# Altium footprint library PcbLib1.PcbLib: 212 footprints (part 3 of 14)
Each footprint in its own frame and in the unit in brackets; x right, y up, seen from the top. Pads: shape width x height; smd on the part's side, far side on the other; paste and mask are expansions set on the pad; w line width, h text height; cw(c..) or ccw(c..) is an arc to the next point about the centre after c.
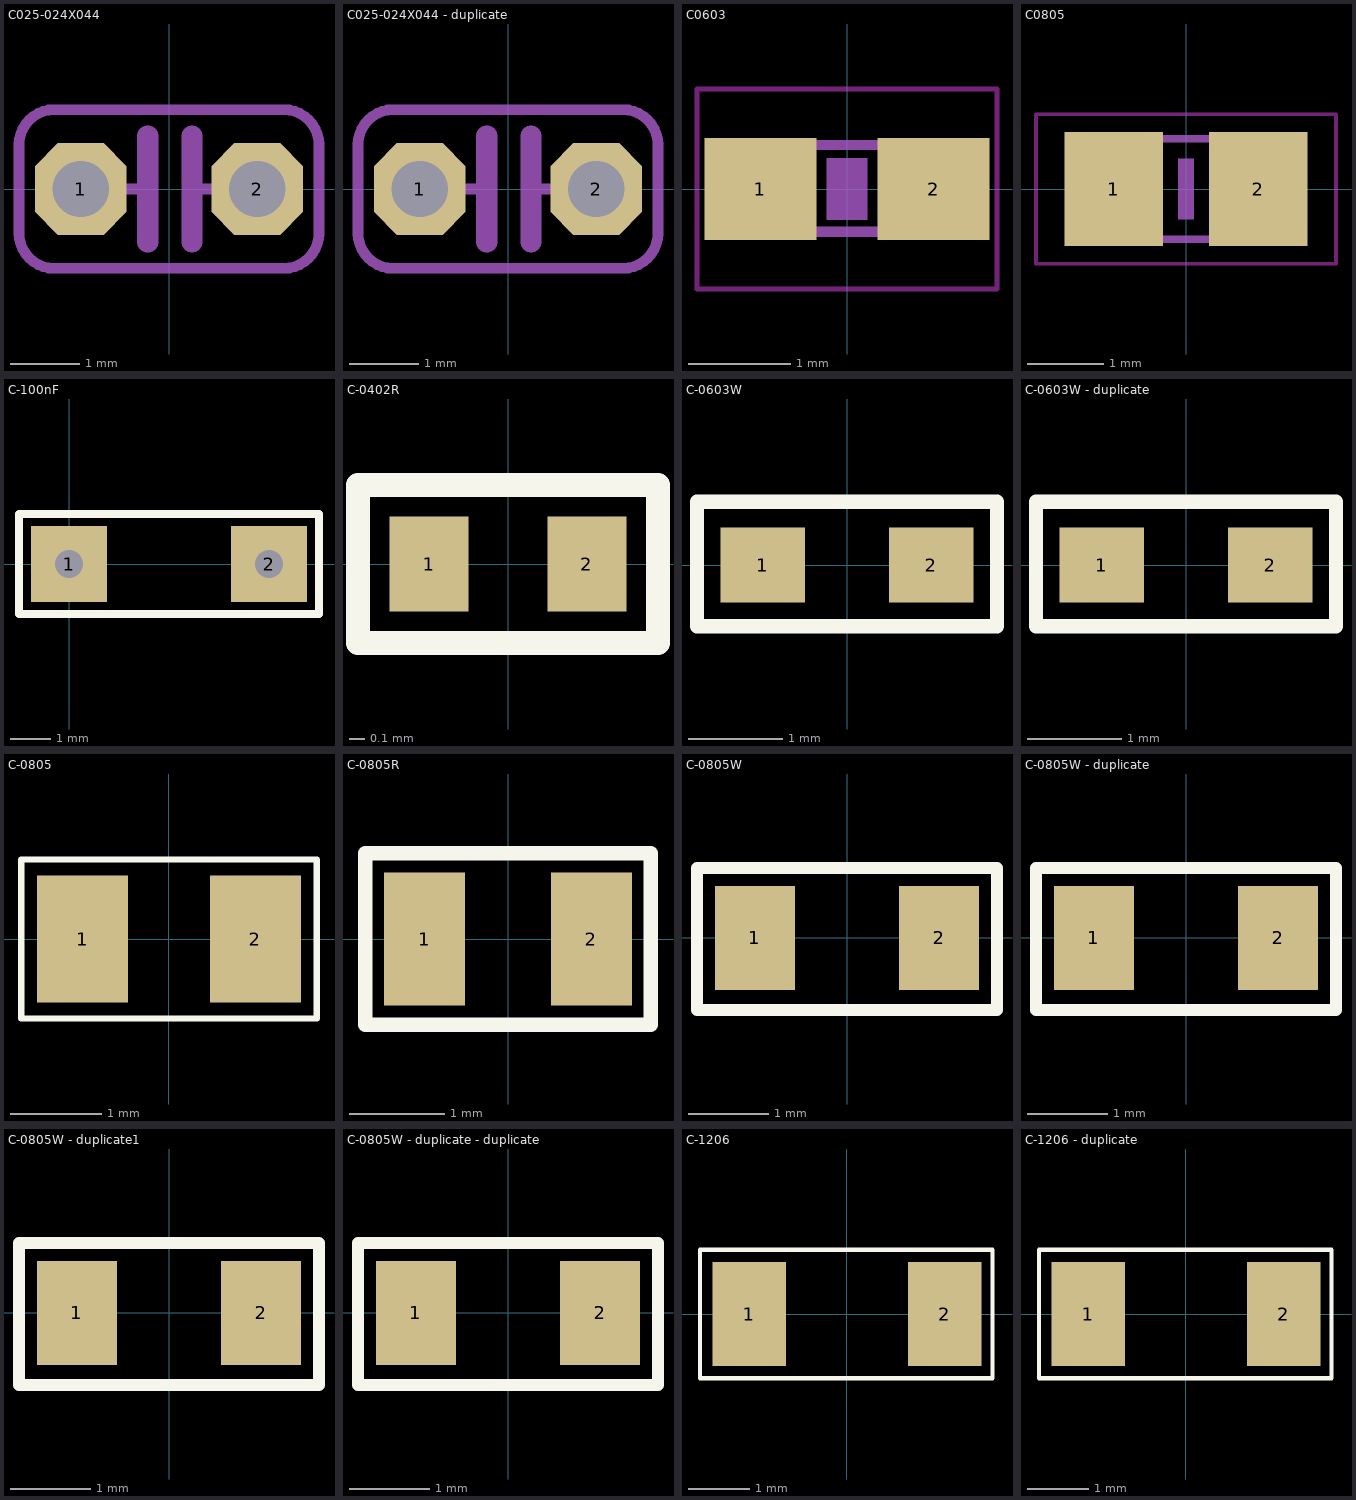
[diagram p2: the footprints below, top view; thin cyan lines are the x and y axes]

## C025-024X044 [mil] "C025-024X044"
pads (2):
  oct 52x52 / inner round 0 / far side oct 52x52 hole 32: 1(-50,0) 2(50,0)
Bottom Assembly:
  lines w6: -50,0 -12,0 ; 13,0 50,0
Bottom 3D Body:
  lines w6: -85,-25 ccw(c-65,-25) -65,-45 65,-45 ccw(c65,-25) 85,-25 85,25 ccw(c65,25) 65,45 -65,45 ccw(c-65,25) -85,25 -85,-25
  lines w12: -12,-30 -12,30 ; 13,-30 13,30
3D body: height 150, standoff 0, extent 9.75,-3.25 53.25,3.25
3D body: height 150, standoff 0, extent -53.25,-3.25 -8.75,3.25
3D body: height 50, standoff 0, extent -74.49,-24.49 -25.51,24.49
3D body: height 50, standoff 0, extent 25.51,-24.49 74.49,24.49

## C025-024X044 - duplicate [mil] "C025-024X044"
pads (2):
  oct 52x52 / inner round 0 / far side oct 52x52 hole 32: 1(-50,0) 2(50,0)
Bottom Assembly:
  lines w6: -50,0 -12,0 ; 13,0 50,0
Bottom 3D Body:
  lines w6: -85,-25 ccw(c-65,-25) -65,-45 65,-45 ccw(c65,-25) 85,-25 85,25 ccw(c65,25) 65,45 -65,45 ccw(c-65,25) -85,25 -85,-25
  lines w12: -12,-30 -12,30 ; 13,-30 13,30
3D body: height 50, standoff 0, extent 25.51,-24.49 74.49,24.49
3D body: height 50, standoff 0, extent -74.49,-24.49 -25.51,24.49
3D body: height 150, standoff 0, extent -53.25,-3.25 -8.75,3.25
3D body: height 150, standoff 0, extent 9.75,-3.25 53.25,3.25

## C0603 [mm] "C0603"
pads (2):
  rect 1.1x1 smd: 1(-0.85,0) 2(0.85,0)
Top Layer keep-out:
  lines w0.051: -1.473,-0.983 1.473,-0.983 1.473,0.983 -1.473,0.983 -1.473,-0.983
Bottom Assembly:
  region: -0.838,-0.47 -0.838,0.48 -0.338,0.48 -0.338,-0.47
  region: 0.33,-0.47 0.33,0.48 0.83,0.48 0.83,-0.47
  lines w0.102: -0.356,-0.419 0.356,-0.419 ; -0.356,0.432 0.356,0.432
Top Glue Points:
  region: -0.2,-0.3 -0.2,0.3 0.2,0.3 0.2,-0.3

## C0805 [mm] "C0805"
pads (2):
  rect 1.3x1.5 smd: 1(-0.95,0) 2(0.95,0)
Top Layer keep-out:
  lines w0.051: -1.973,-0.983 1.973,-0.983 1.973,0.983 -1.973,0.983 -1.973,-0.983
Bottom Assembly:
  region: -1.092,-0.724 -1.092,0.726 -0.342,0.726 -0.342,-0.724
  region: 0.356,-0.724 0.356,0.726 1.106,0.726 1.106,-0.724
  lines w0.102: -0.381,0.66 0.381,0.66 ; -0.356,-0.66 0.381,-0.66
Top Glue Points:
  region: -0.1,-0.4 -0.1,0.4 0.1,0.4 0.1,-0.4

## C-100nF [mm]
pads (2):
  rect 1.9x1.9 hole 0.7: 1(0,0)
  rect 1.9x1.9 / inner round 1.2 / far side round 1.2 hole 0.7: 2(5,0)
Top Overlay:
  lines w0.2: -1.25,-1.25 -1.25,1.25 0,1.25 5,1.25 6.25,1.25 6.25,-1.25 5,-1.25 0,-1.25 -1.25,-1.25

## C-0402R [mm] "Capacitor 0402 reflow soldering"
pads (2):
  rect 0.5x0.6 smd: 1(-0.5,0) 2(0.5,0)
Top Overlay:
  lines w0.152: 0.5,-0.5 0.95,-0.5 0.95,0.5 0.5,0.5 -0.95,0.5 -0.95,-0.5 0.508,-0.5
3D body "CAP0402.stp": height 0.2, standoff 0, extent -0.5,-0.3 0.5,0.3

## C-0603W [mm] "capacitor 0603 wave soldering"
pads (2):
  rect 0.9x0.8 smd: 1(-0.9,0) 2(0.9,0)
Top Overlay:
  lines w0.152: -1.6,-0.65 -1.6,0.675 0.525,0.675 1.6,0.675 1.6,-0.65 0.55,-0.65 -1.6,-0.65
3D body "CAP0603.stp": height 0.3, standoff 0, extent -0.8,-0.4 0.8,0.4

## C-0603W - duplicate [mm] "capacitor 0603 wave soldering"
pads (2):
  rect 0.9x0.8 smd: 1(-0.9,0) 2(0.9,0)
Top Overlay:
  lines w0.152: -1.6,-0.65 -1.6,0.675 0.525,0.675 1.6,0.675 1.6,-0.65 0.55,-0.65 -1.6,-0.65
3D body "CAP0603.stp": height 0.3, standoff 0, extent -0.8,-0.4 0.8,0.4

## C-0805 [mm]
pads (2):
  rect 1x1.4 smd: 1(-0.95,0) 2(0.95,0)
Top Overlay:
  lines w0.07: -1.625,-0.875 -1.625,0.413 -1.625,0.875 1.625,0.875 1.625,-0.875 0.416,-0.875 -0.391,-0.875 -1.625,-0.875
3D body "User Library-CAPC2013X10.STEP": height 1.01, standoff 0.01, extent -1,-0.625 1,0.625

## C-0805R [mm] "capacitor 0805 reflow soldering"
pads (2):
  rect 0.85x1.4 smd: 1(-0.875,0) 2(0.875,0)
Top Overlay:
  lines w0.152: -1.5,-0.9 -1.5,0.9 1.5,0.9 1.5,-0.9 0.625,-0.9 -1.5,-0.9
3D body "CAP0805.stp": height 0.78, standoff 0, extent -1,-0.625 1,0.625

## C-0805W [mm] "capacitor 0805 wave soldering"
pads (2):
  rect 1x1.3 smd: 1(-1.15,0) 2(1.15,0)
Top Overlay:
  lines w0.152: -1.875,-0.9 0.6,-0.9 1.875,-0.9 1.875,0.875 0.6,0.875 -1.875,0.875 -1.875,-0.9
3D body "CAP0805.stp": height 0.78, standoff 0, extent -1,-0.625 1,0.625

## C-0805W - duplicate [mm] "capacitor 0805 wave soldering"
pads (2):
  rect 1x1.3 smd: 1(-1.15,0) 2(1.15,0)
Top Overlay:
  lines w0.152: -1.875,-0.9 0.6,-0.9 1.875,-0.9 1.875,0.875 0.6,0.875 -1.875,0.875 -1.875,-0.9
3D body "CAP0805.stp": height 0.78, standoff 0, extent -1,-0.625 1,0.625

## C-0805W - duplicate1 [mm] "capacitor 0805 wave soldering"
pads (2):
  rect 1x1.3 smd: 1(-1.15,0) 2(1.15,0)
Top Overlay:
  lines w0.152: -1.875,-0.9 -1.875,0.875 0.6,0.875 1.875,0.875 1.875,-0.9 0.6,-0.9 -1.875,-0.9
3D body "CAP0805.stp": height 0.78, standoff 0, extent -1,-0.625 1,0.625

## C-0805W - duplicate - duplicate [mm] "capacitor 0805 wave soldering"
pads (2):
  rect 1x1.3 smd: 1(-1.15,0) 2(1.15,0)
Top Overlay:
  lines w0.152: -1.875,-0.9 0.6,-0.9 1.875,-0.9 1.875,0.875 0.6,0.875 -1.875,0.875 -1.875,-0.9
3D body "CAP0805.stp": height 0.78, standoff 0, extent -1,-0.625 1,0.625

## C-1206 [mm]
pads (2):
  rect 1.2x1.7 smd: 1(-1.6,0) 2(1.6,0)
Top Overlay:
  lines w0.07: -2.4,-1.05 -2.4,1.05 2.375,1.05 2.375,0.692 2.375,0.556 2.375,-0.531 2.375,-1.05 -2.4,-1.05
3D body "User Library-CAPC3216X10.STEP": height 1, standoff 0, extent -1.6,-0.8 1.6,0.8

## C-1206 - duplicate [mm]
pads (2):
  rect 1.2x1.7 smd: 1(-1.6,0) 2(1.6,0)
Top Overlay:
  lines w0.07: -2.4,-1.05 2.375,-1.05 2.375,-0.531 2.375,0.556 2.375,0.692 2.375,1.05 -2.4,1.05 -2.4,-1.05
3D body "User Library-CAPC3216X10.STEP": height 1, standoff 0, extent -1.6,-0.8 1.6,0.8